# Altium footprint library DIP Switch.PcbLib: 31 footprints (part 2 of 2)
Each footprint in its own frame and in the unit in brackets; x right, y up, seen from the top. Pads: shape width x height; smd on the part's side, far side on the other; paste and mask are expansions set on the pad; w line width, h text height; cw(c..) or ccw(c..) is an arc to the next point about the centre after c.
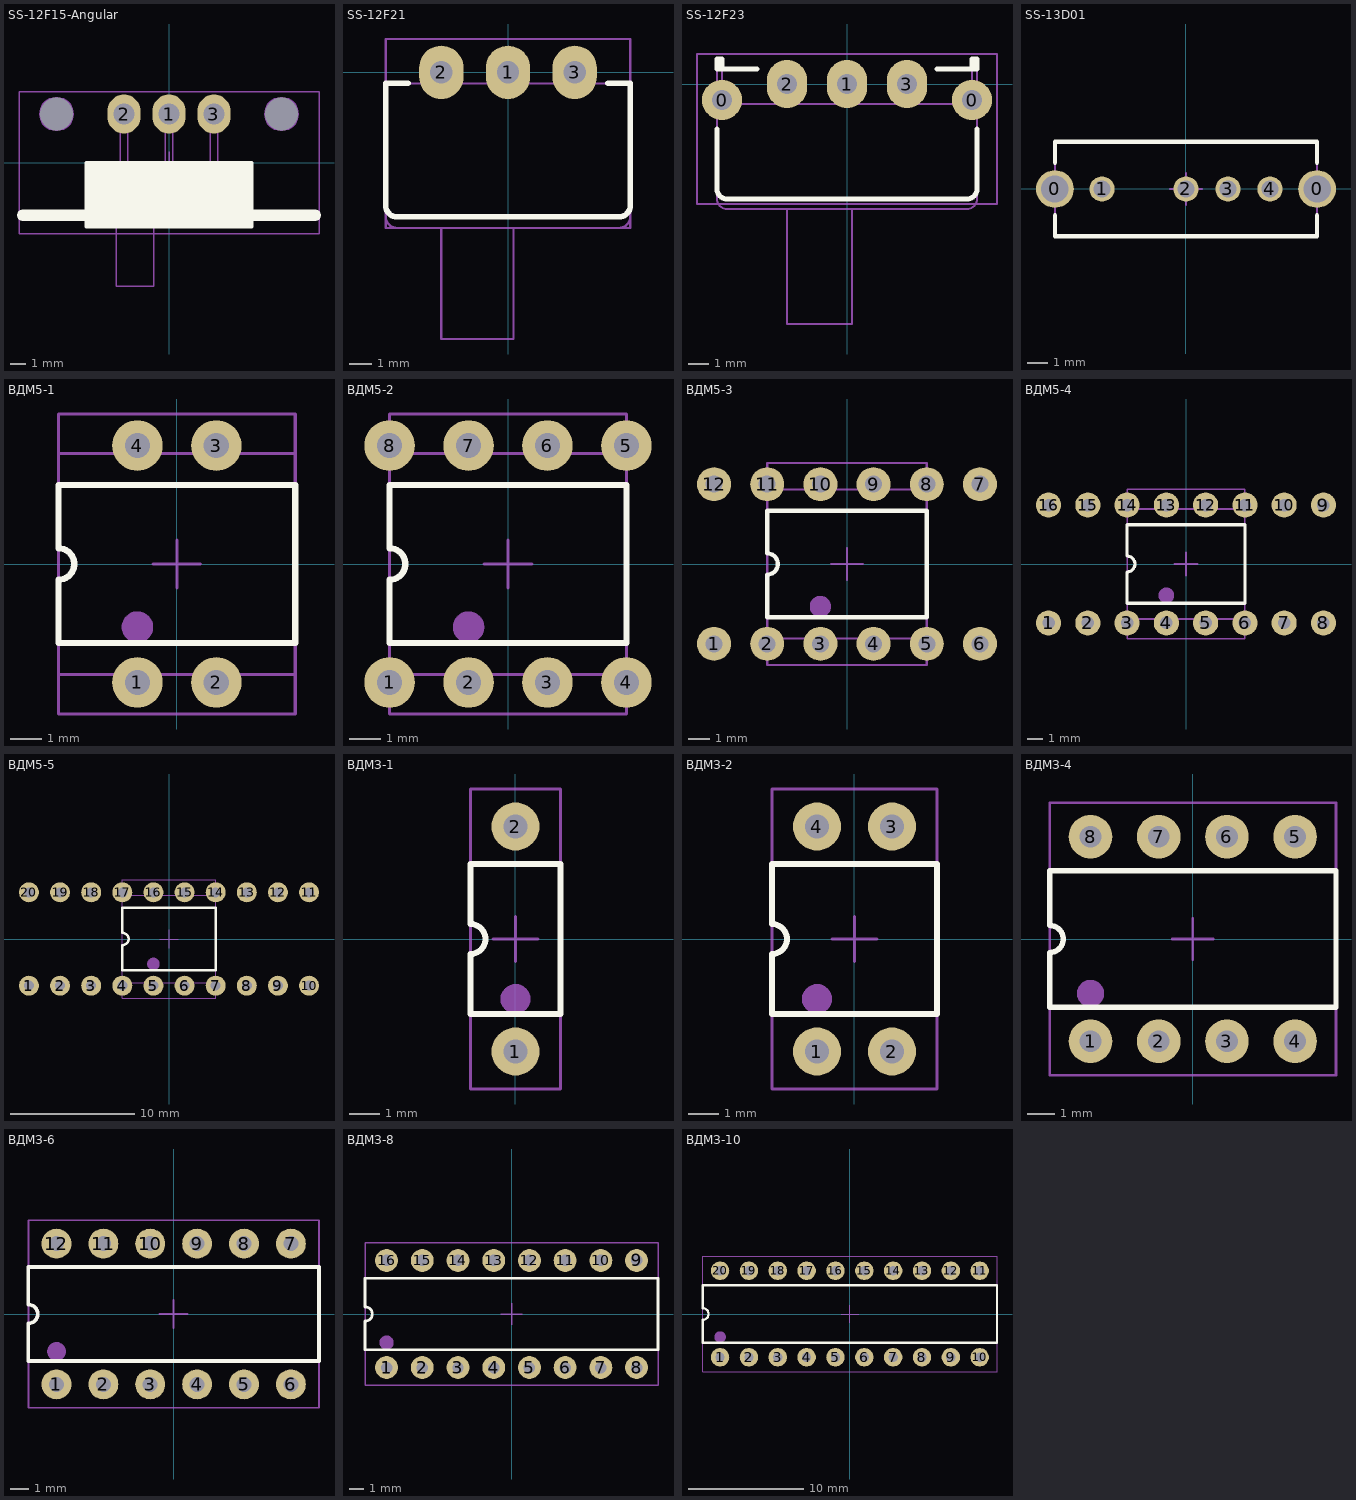
[diagram p1: the footprints below, top view; thin cyan lines are the x and y axes]

## SS-12F15-Angular [mm]
height 5.6
pads (5):
  round 0 hole 2.2: 0(-7.5,3.25) 0(7.5,3.25)
  oval 2.2x2.6 hole 1.4: 1(0,3.25) 2(-3,3.25) 3(3,3.25)
Top Overlay:
  rectangle: 5.5,-3.75 10,-3.25
  rectangle: -10,-3.75 -5.5,-3.25
  rectangle: -5.5,-4.25 5.5,0
  lines w0.25: -5.5,-3.75 -9.75,-3.75 cw(c-9.75,-3.5) -10,-3.5 cw(c-9.75,-3.5) -9.75,-3.25 -5.5,-3.25 ; 5.5,-3.75 9.75,-3.75 ccw(c9.75,-3.5) 10,-3.5 ccw(c9.75,-3.5) 9.75,-3.25 5.5,-3.25 ; -5.5,-4.25 -5.5,0 5.5,0 5.5,-4.25 -5.5,-4.25
Mechanical 13:
  lines w0.1: -5.5,-3.75 -9.75,-3.75 cw(c-9.75,-3.5) -10,-3.5 cw(c-9.75,-3.5) -9.75,-3.25 -5.5,-3.25 ; -3.5,-4.25 -3.5,-8.25 -1,-8.25 -1,-4.25 ; -3.25,0 -3.25,4 -2.75,4 -2.75,0 ; -0.25,0 -0.25,4 0.25,4 0.25,0 ; 2.75,0 2.75,4 3.25,4 3.25,0 ; 5.5,-3.75 9.75,-3.75 ccw(c9.75,-3.5) 10,-3.5 ccw(c9.75,-3.5) 9.75,-3.25 5.5,-3.25 ; -5.5,-4.25 5.5,-4.25 5.5,0 -5.5,0 -5.5,-4.25
Mechanical 15:
  circle w0.1: c-7.5,3.25 r1.1
  circle w0.1: c7.5,3.25 r1.1
  lines w0.1: -0.75,0 0.75,0 ; 0,-0.75 0,0.75 ; -10,-4.75 -10,4.75 10,4.75 10,-4.75 -10,-4.75
3D body: height 6.6, standoff 0.4, extent -7,-8.4 7,3.85

## SS-12F21 [mm]
height 5.8
pads (3):
  oval 2x2.4 hole 1: 1(0,0) 2(-3,0) 3(3,0)
Top Overlay:
  lines w0.25: -4.5,-0.5 -5.5,-0.5 -5.5,-6 ccw(c-5,-6) -5,-6.5 5,-6.5 ccw(c5,-6) 5.5,-6 5.5,-0.5 4.5,-0.5
Mechanical 13:
  lines w0.1: -3,-7 -3,-12 0.25,-12 0.25,-7 ; -5.5,-6.5 ccw(c-5,-6.5) -5,-7 5,-7 ccw(c5,-6.5) 5.5,-6.5 5.5,-0.5 -5.5,-0.5 -5.5,-6.5
Mechanical 15:
  lines w0.1: -0.75,0 0.75,0 ; 0,-0.75 0,0.75 ; -5.5,-7 -5.5,1.5 5.5,1.5 5.5,-7 -5.5,-7

## SS-12F23 [mm]
height 5.7
pads (5):
  round 2 hole 1: 0(-6.25,-0.8) 0(6.25,-0.8)
  oval 2x2.4 hole 1: 1(0,0) 2(-3,0) 3(3,0)
Top Overlay:
  lines w0.25: -6.5,-2.25 -6.5,-5.25 ccw(c-6,-5.25) -6,-5.75 6,-5.75 ccw(c6,-5.25) 6.5,-5.25 6.5,-2.25 ; -6.25,0.75 -6.25,1.25 -6.5,1.25 -6.5,0.75 -4.5,0.75 ; 4.5,0.75 6.5,0.75 6.5,1.25 6.25,1.25 6.25,0.75
Mechanical 13:
  lines w0.1: -6.5,0.75 -6.5,-5.75 ccw(c-6,-5.75) -6,-6.25 6,-6.25 ccw(c6,-5.75) 6.5,-5.75 6.5,0.75 ; -6.25,-1 -6.25,1.25 -6.5,1.25 -6.5,-1 6.5,-1 6.5,1.25 6.25,1.25 6.25,-1 ; -3,-6.25 -3,-12 0.25,-12 0.25,-6.25
Mechanical 15:
  lines w0.1: -0.75,0 0.75,0 ; 0,-0.75 0,0.75 ; -7.5,-6 -7.5,1.5 7.5,1.5 7.5,-6 -7.5,-6
3D body: height 5.85, standoff -3.25, extent -6.5,-12.15 6.5,0.75

## SS-13D01 [mm]
height 4.7
pads (6):
  round 1.8 hole 1.3: 0(-6.25,0) 0(6.25,0)
  round 1.2 hole 0.8: 1(-4,0) 2(0,0) 3(2,0) 4(4,0)
Top Overlay:
  lines w0.2: -6.25,-1.25 -6.25,-2.25 6.25,-2.25 6.25,-1.25 ; -6.25,1.25 -6.25,2.25 6.25,2.25 6.25,1.25
Mechanical 13:
  lines w0.1: -6.25,-2.25 6.25,-2.25 6.25,2.25 -6.25,2.25 -6.25,-2.25
  text "NOT READY!" at -6.5,2.5 h1.52
Mechanical 15:
  lines w0.1: -0.75,0 0.75,0 ; 0,-0.75 0,0.75 ; -6.25,-2.25 -6.25,2.25 6.25,2.25 6.25,-2.25 -6.25,-2.25

## ВДМ5-1 [mm]
height 4.5
pads (4):
  round 1.6 hole 0.8: 1(-1.25,-3.75) 2(1.25,-3.75) 3(1.25,3.75) 4(-1.25,3.75)
Top Overlay:
  lines w0.2: -3.75,-2.5 3.75,-2.5 3.75,2.5 -3.75,2.5 -3.75,0.5 cw(c-3.75,0) -3.75,-0.5 -3.75,-2.5
Mechanical 13:
  circle w0.5: c-1.25,-2 r0.25
  lines w0.1: -3.75,-3.5 -3.75,3.5 3.75,3.5 3.75,-3.5 -3.75,-3.5
Mechanical 15:
  lines w0.1: -0.75,0 0.75,0 ; 0,-0.75 0,0.75 ; -3.75,-4.75 3.75,-4.75 3.75,4.75 -3.75,4.75 -3.75,-4.75

## ВДМ5-2 [mm]
height 4.5
pads (8):
  round 1.6 hole 0.8: 1(-3.75,-3.75) 2(-1.25,-3.75) 3(1.25,-3.75) 4(3.75,-3.75) 5(3.75,3.75) 6(1.25,3.75) 7(-1.25,3.75) 8(-3.75,3.75)
Top Overlay:
  lines w0.2: -3.75,-2.5 3.75,-2.5 3.75,2.5 -3.75,2.5 -3.75,0.5 cw(c-3.75,0) -3.75,-0.5 -3.75,-2.5
Mechanical 13:
  circle w0.5: c-1.25,-2 r0.25
  lines w0.1: -3.75,-3.5 -3.75,3.5 3.75,3.5 3.75,-3.5 -3.75,-3.5
  text "Not Ready!" at -6,4.75 h1.52
Mechanical 15:
  lines w0.1: -0.75,0 0.75,0 ; 0,-0.75 0,0.75 ; -3.75,-4.75 3.75,-4.75 3.75,4.75 -3.75,4.75 -3.75,-4.75

## ВДМ5-3 [mm]
height 4.5
pads (12):
  round 1.6 hole 0.8: 1(-6.25,-3.75) 2(-3.75,-3.75) 3(-1.25,-3.75) 4(1.25,-3.75) 5(3.75,-3.75) 6(6.25,-3.75) 7(6.25,3.75) 8(3.75,3.75) 9(1.25,3.75) 10(-1.25,3.75) 11(-3.75,3.75) 12(-6.25,3.75)
Top Overlay:
  lines w0.2: -3.75,-2.5 3.75,-2.5 3.75,2.5 -3.75,2.5 -3.75,0.5 cw(c-3.75,0) -3.75,-0.5 -3.75,-2.5
Mechanical 13:
  circle w0.5: c-1.25,-2 r0.25
  lines w0.1: -3.75,-3.5 -3.75,3.5 3.75,3.5 3.75,-3.5 -3.75,-3.5
  text "Not Ready!" at -6,4.75 h1.52
Mechanical 15:
  lines w0.1: -0.75,0 0.75,0 ; 0,-0.75 0,0.75 ; -3.75,-4.75 3.75,-4.75 3.75,4.75 -3.75,4.75 -3.75,-4.75

## ВДМ5-4 [mm]
height 4.5
pads (16):
  round 1.6 hole 0.8: 1(-8.75,-3.75) 2(-6.25,-3.75) 3(-3.75,-3.75) 4(-1.25,-3.75) 5(1.25,-3.75) 6(3.75,-3.75) 7(6.25,-3.75) 8(8.75,-3.75) 9(8.75,3.75) 10(6.25,3.75) 11(3.75,3.75) 12(1.25,3.75) 13(-1.25,3.75) 14(-3.75,3.75) 15(-6.25,3.75) 16(-8.75,3.75)
Top Overlay:
  lines w0.2: -3.75,-2.5 -3.75,-0.5 ccw(c-3.75,0) -3.75,0.5 -3.75,2.5 3.75,2.5 3.75,-2.5 -3.75,-2.5
Mechanical 13:
  circle w0.5: c-1.25,-2 r0.25
  lines w0.1: -3.75,-3.5 3.75,-3.5 3.75,3.5 -3.75,3.5 -3.75,-3.5
  text "Not Ready!" at -6,4.75 h1.52
Mechanical 15:
  lines w0.1: -0.75,0 0.75,0 ; 0,-0.75 0,0.75 ; -3.75,-4.75 -3.75,4.75 3.75,4.75 3.75,-4.75 -3.75,-4.75

## ВДМ5-5 [mm]
height 4.5
pads (20):
  round 1.6 hole 0.8: 1(-11.25,-3.75) 2(-8.75,-3.75) 3(-6.25,-3.75) 4(-3.75,-3.75) 5(-1.25,-3.75) 6(1.25,-3.75) 7(3.75,-3.75) 8(6.25,-3.75) 9(8.75,-3.75) 10(11.25,-3.75) 11(11.25,3.75) 12(8.75,3.75) 13(6.25,3.75) 14(3.75,3.75) 15(1.25,3.75) 16(-1.25,3.75) 17(-3.75,3.75) 18(-6.25,3.75) 19(-8.75,3.75) 20(-11.25,3.75)
Top Overlay:
  lines w0.2: -3.75,-2.5 -3.75,-0.5 ccw(c-3.75,0) -3.75,0.5 -3.75,2.5 3.75,2.5 3.75,-2.5 -3.75,-2.5
Mechanical 13:
  circle w0.5: c-1.25,-2 r0.25
  lines w0.1: -3.75,-3.5 3.75,-3.5 3.75,3.5 -3.75,3.5 -3.75,-3.5
  text "Not Ready!" at -6,4.75 h1.52
Mechanical 15:
  lines w0.1: -0.75,0 0.75,0 ; 0,-0.75 0,0.75 ; -3.75,-4.75 -3.75,4.75 3.75,4.75 3.75,-4.75 -3.75,-4.75

## ВДМЗ-1 [mm]
height 9
pads (2):
  round 1.6 hole 0.8: 1(0,-3.75) 2(0,3.75)
Top Overlay:
  lines w0.2: -1.5,-2.5 -1.5,-0.5 ccw(c-1.5,0) -1.5,0.5 -1.5,2.5 1.5,2.5 1.5,-2.5 -1.5,-2.5
Mechanical 13:
  circle w0.5: c0,-2 r0.25
  lines w0.1: -1.5,-5 1.5,-5 1.5,5 -1.5,5 -1.5,-5
Mechanical 15:
  lines w0.1: -0.75,0 0.75,0 ; 0,-0.75 0,0.75 ; -1.5,-5 -1.5,5 1.5,5 1.5,-5 -1.5,-5

## ВДМЗ-2 [mm]
height 9
pads (4):
  round 1.6 hole 0.8: 1(-1.25,-3.75) 2(1.25,-3.75) 3(1.25,3.75) 4(-1.25,3.75)
Top Overlay:
  lines w0.2: -2.75,-2.5 -2.75,-0.5 ccw(c-2.75,0) -2.75,0.5 -2.75,2.5 2.75,2.5 2.75,-2.5 -2.75,-2.5
Mechanical 13:
  circle w0.5: c-1.25,-2 r0.25
  lines w0.1: -2.75,-5 2.75,-5 2.75,5 -2.75,5 -2.75,-5
Mechanical 15:
  lines w0.1: -0.75,0 0.75,0 ; 0,-0.75 0,0.75 ; -2.75,-5 -2.75,5 2.75,5 2.75,-5 -2.75,-5
3D body: height 4.9, standoff -2.7, extent -2.76,-3.927 2.76,3.943

## ВДМЗ-4 [mm]
height 9
pads (8):
  round 1.6 hole 0.8: 1(-3.75,-3.75) 2(-1.25,-3.75) 3(1.25,-3.75) 4(3.75,-3.75) 5(3.75,3.75) 6(1.25,3.75) 7(-1.25,3.75) 8(-3.75,3.75)
Top Overlay:
  lines w0.2: -5.25,-2.5 -5.25,-0.5 ccw(c-5.25,0) -5.25,0.5 -5.25,2.5 5.25,2.5 5.25,-2.5 -5.25,-2.5
Mechanical 13:
  circle w0.5: c-3.75,-2 r0.25
  lines w0.1: -5.25,-5 5.25,-5 5.25,5 -5.25,5 -5.25,-5
Mechanical 15:
  lines w0.1: -0.75,0 0.75,0 ; 0,-0.75 0,0.75 ; -5.25,-5 -5.25,5 5.25,5 5.25,-5 -5.25,-5
3D body: height 4.9, standoff -2.7, extent -5.3,-3.927 5.3,3.943

## ВДМЗ-6 [mm]
height 9
pads (12):
  round 1.6 hole 0.8: 1(-6.25,-3.75) 2(-3.75,-3.75) 3(-1.25,-3.75) 4(1.25,-3.75) 5(3.75,-3.75) 6(6.25,-3.75) 7(6.25,3.75) 8(3.75,3.75) 9(1.25,3.75) 10(-1.25,3.75) 11(-3.75,3.75) 12(-6.25,3.75)
Top Overlay:
  lines w0.2: -7.75,-2.5 -7.75,-0.5 ccw(c-7.75,0) -7.75,0.5 -7.75,2.5 7.75,2.5 7.75,-2.5 -7.75,-2.5
Mechanical 13:
  circle w0.5: c-6.25,-2 r0.25
  lines w0.1: -7.75,-5 7.75,-5 7.75,5 -7.75,5 -7.75,-5
Mechanical 15:
  lines w0.1: -0.75,0 0.75,0 ; 0,-0.75 0,0.75 ; -7.75,-5 -7.75,5 7.75,5 7.75,-5 -7.75,-5
3D body: height 4.9, standoff -2.7, extent -7.84,-3.927 7.84,3.943

## ВДМЗ-8 [mm]
height 9
pads (16):
  round 1.6 hole 0.8: 1(-8.75,-3.75) 2(-6.25,-3.75) 3(-3.75,-3.75) 4(-1.25,-3.75) 5(1.25,-3.75) 6(3.75,-3.75) 7(6.25,-3.75) 8(8.75,-3.75) 9(8.75,3.75) 10(6.25,3.75) 11(3.75,3.75) 12(1.25,3.75) 13(-1.25,3.75) 14(-3.75,3.75) 15(-6.25,3.75) 16(-8.75,3.75)
Top Overlay:
  lines w0.2: -10.25,-2.5 -10.25,-0.5 ccw(c-10.25,0) -10.25,0.5 -10.25,2.5 10.25,2.5 10.25,-2.5 -10.25,-2.5
Mechanical 13:
  circle w0.5: c-8.75,-2 r0.25
  lines w0.1: -10.25,-5 10.25,-5 10.25,5 -10.25,5 -10.25,-5
Mechanical 15:
  lines w0.1: -0.75,0 0.75,0 ; 0,-0.75 0,0.75 ; -10.25,-5 -10.25,5 10.25,5 10.25,-5 -10.25,-5
3D body: height 4.9, standoff -2.7, extent -10.38,-3.927 10.38,3.943

## ВДМЗ-10 [mm]
height 9
pads (20):
  round 1.6 hole 0.8: 1(-11.25,-3.75) 2(-8.75,-3.75) 3(-6.25,-3.75) 4(-3.75,-3.75) 5(-1.25,-3.75) 6(1.25,-3.75) 7(3.75,-3.75) 8(6.25,-3.75) 9(8.75,-3.75) 10(11.25,-3.75) 11(11.25,3.75) 12(8.75,3.75) 13(6.25,3.75) 14(3.75,3.75) 15(1.25,3.75) 16(-1.25,3.75) 17(-3.75,3.75) 18(-6.25,3.75) 19(-8.75,3.75) 20(-11.25,3.75)
Top Overlay:
  lines w0.2: -12.75,-2.5 12.75,-2.5 12.75,2.5 -12.75,2.5 -12.75,0.5 cw(c-12.75,0) -12.75,-0.5 -12.75,-2.5
Mechanical 13:
  circle w0.5: c-11.25,-2 r0.25
  lines w0.1: -12.75,-5 -12.75,5 12.75,5 12.75,-5 -12.75,-5
Mechanical 15:
  lines w0.1: -0.75,0 0.75,0 ; 0,-0.75 0,0.75 ; -12.75,-5 12.75,-5 12.75,5 -12.75,5 -12.75,-5
3D body: height 4.9, standoff -2.7, extent -12.92,-3.927 12.92,3.943